# Altium footprint library En.PcbLib: 157 footprints (part 4 of 10)
Each footprint in its own frame and in the unit in brackets; x right, y up, seen from the top. Pads: shape width x height; smd on the part's side, far side on the other; paste and mask are expansions set on the pad; w line width, h text height; cw(c..) or ccw(c..) is an arc to the next point about the centre after c.
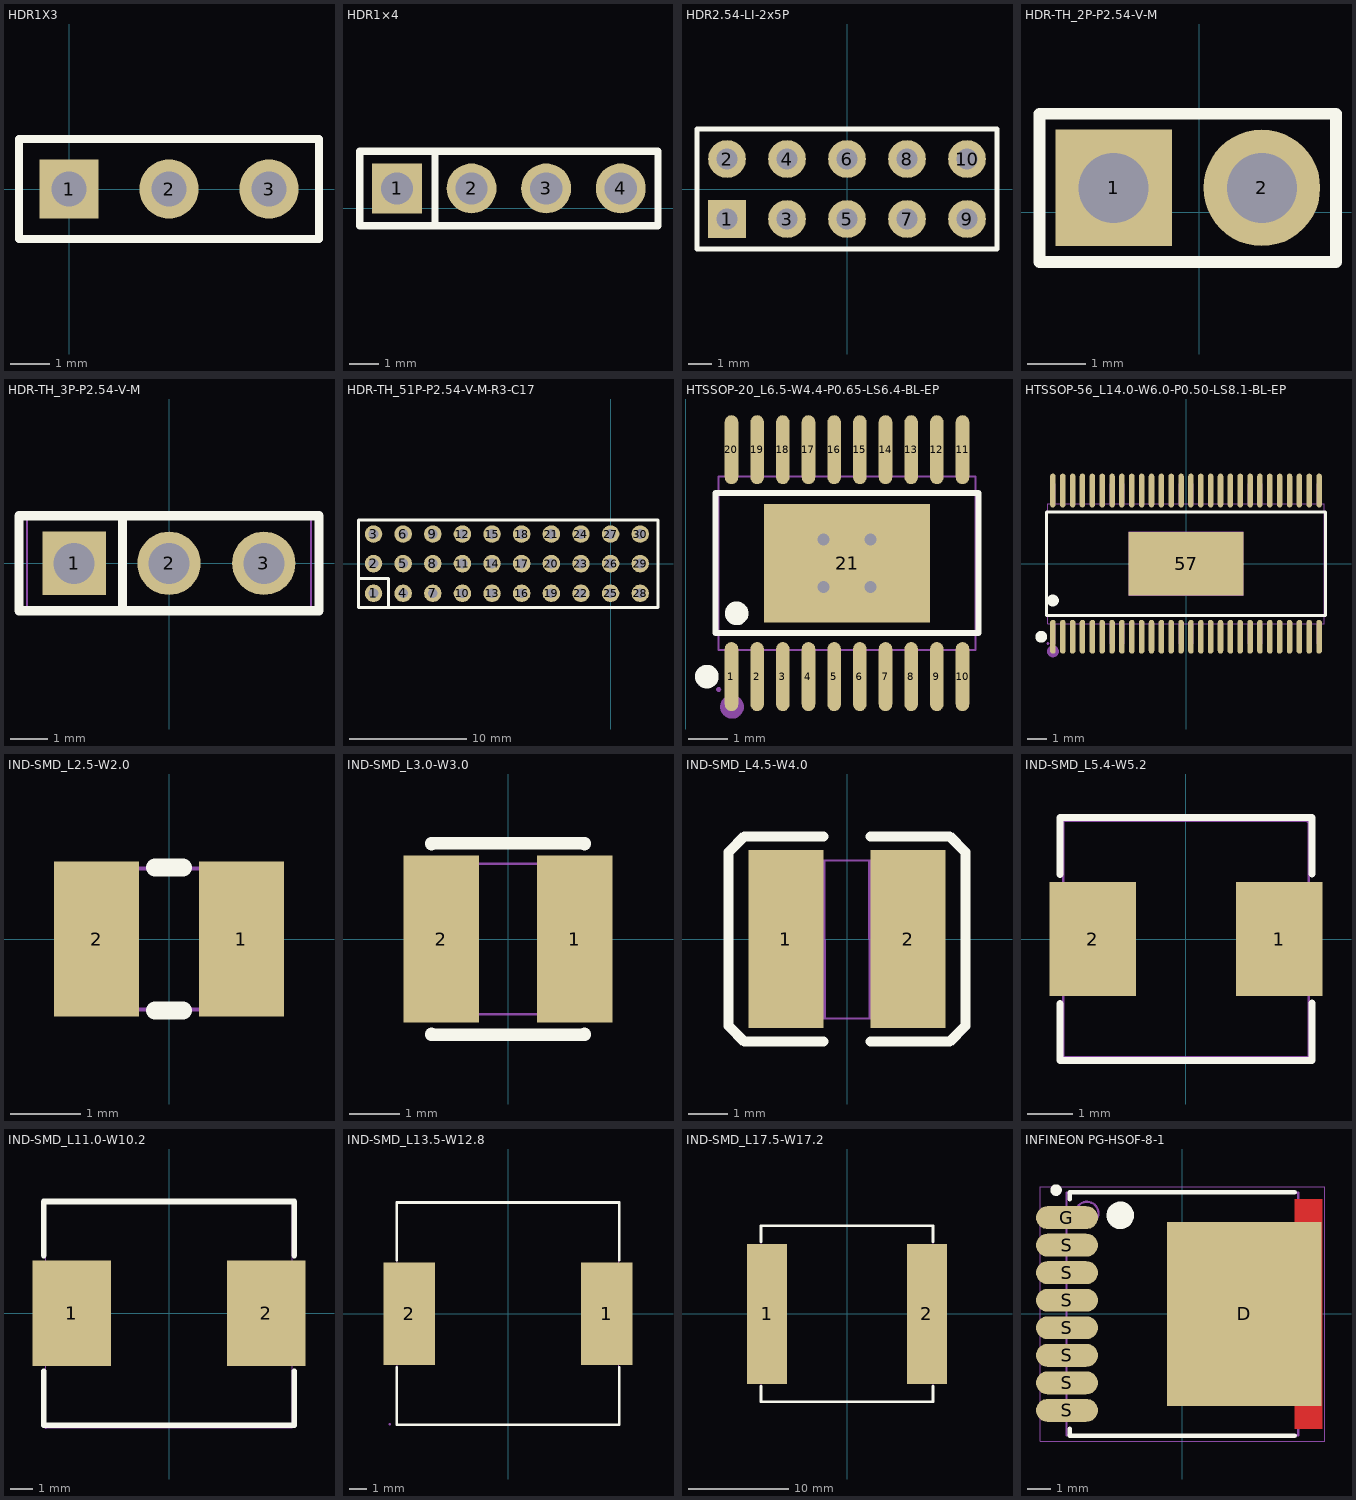
[diagram p3: the footprints below, top view; thin cyan lines are the x and y axes]

## HDR1X3 [mm] "Connector; Header; 3 Position"
pads (3):
  rect 1.5x1.5 hole 0.9: 1(0,0)
  round 1.5 hole 0.9: 2(2.54,0) 3(5.08,0)
Top Overlay:
  lines w0.2: -1.27,-1.27 6.35,-1.27 6.35,1.27 -1.27,1.27 -1.27,-1.27

## HDR1×4 [mm]
pads (4):
  rect 1.7x1.7 hole 1.1: 1(27.492,0.675)
  round 1.7 hole 1.1: 2(30.032,0.675) 3(32.572,0.675) 4(35.112,0.675)
Top Overlay:
  lines w0.254: 28.785,-0.595 28.785,1.945 ; 28.785,1.945 26.222,1.945 26.222,-0.595 36.382,-0.595 36.382,1.945 28.785,1.945
Mechanical 15:
  region: 34.792,0.995 35.432,0.995 35.432,0.355 34.792,0.355
  region: 32.252,0.995 32.892,0.995 32.892,0.355 32.252,0.355
  region: 29.712,0.995 30.352,0.995 30.352,0.355 29.712,0.355
  region: 27.172,0.995 27.812,0.995 27.812,0.355 27.172,0.355
  region: 26.282,-0.575 26.282,-0.55 26.247,-0.515 26.197,-0.515 26.162,-0.55 26.162,-0.575 26.162,-0.6 26.197,-0.635 26.247,-0.635 26.282,-0.6
  lines w0.051: 26.222,-0.575 36.382,-0.575 36.382,1.925 26.222,1.925 26.222,-0.575

## HDR2.54-LI-2x5P [mm] "双排排针，5x2脚"
pads (10):
  rect 1.6x1.6 hole 0.9: 1(-5.08,-1.27)
  round 1.6 hole 0.9: 2(-5.08,1.27) 3(-2.54,-1.27) 4(-2.54,1.27) 5(0,-1.27) 6(0,1.27) 7(2.54,-1.27) 8(2.54,1.27) 9(5.08,-1.27) 10(5.08,1.27)
Top Overlay:
  lines w0.2: -6.35,-2.54 6.35,-2.54 6.35,2.54 -6.35,2.54 -6.35,-2.54
3D body "HDR2.54-1x2P.STEP": height 8.5, standoff -3, extent 3.81,-2.54 6.35,2.54
3D body "HDR2.54-1x2P.STEP": height 8.5, standoff -3, extent -3.81,-2.54 -1.27,2.54
3D body "HDR2.54-1x2P.STEP": height 8.5, standoff -3, extent -6.35,-2.54 -3.81,2.54
3D body "HDR2.54-1x2P.STEP": height 8.5, standoff -3, extent 1.27,-2.54 3.81,2.54
3D body "HDR2.54-1x2P.STEP": height 8.5, standoff -3, extent -1.27,-2.54 1.27,2.54

## HDR-TH_2P-P2.54-V-M [mm]
pads (2):
  rect 2x2 hole 1.2: 1(-1.464,0.421)
  round 2 hole 1.2: 2(1.076,0.421)
Top Overlay:
  lines w0.203: -2.734,-0.849 2.346,-0.849 2.346,1.691 -0.829,1.691 -2.734,1.691 -2.734,-0.849
Mechanical 15:
  region: -2.674,-0.829 -2.674,-0.804 -2.709,-0.769 -2.759,-0.769 -2.794,-0.804 -2.794,-0.829 -2.794,-0.854 -2.759,-0.889 -2.709,-0.889 -2.674,-0.854
  region: 0.756,0.741 1.396,0.741 1.396,0.101 0.756,0.101
  region: -1.784,0.741 -1.144,0.741 -1.144,0.101 -1.784,0.101
  lines w0.051: -2.734,-0.829 -2.734,1.671 2.346,1.671 2.346,-0.829 -2.734,-0.829

## HDR-TH_3P-P2.54-V-M [mm]
pads (3):
  rect 1.7x1.7 hole 1.1: 1(-2.54,0)
  round 1.7 hole 1.1: 2(0,0) 3(2.54,0)
Top Overlay:
  lines w0.254: -1.246,-1.27 -1.246,1.27 ; -4.02,-1.27 -4.02,1.27 4.02,1.27 4.02,-1.27 -4.02,-1.27
Mechanical 15:
  region: -2.86,0.32 -2.22,0.32 -2.22,-0.32 -2.86,-0.32
  region: -0.32,0.32 0.32,0.32 0.32,-0.32 -0.32,-0.32
  region: 2.22,0.32 2.86,0.32 2.86,-0.32 2.22,-0.32
  region: -3.75,-1.25 -3.751,-1.226 -3.786,-1.192 -3.834,-1.192 -3.869,-1.226 -3.87,-1.25 -3.869,-1.274 -3.834,-1.308 -3.786,-1.308 -3.751,-1.274
  lines w0.051: -3.81,-1.25 3.81,-1.25 3.81,1.25 -3.81,1.25 -3.81,-1.25
3D body "User Library-1x3 TH Pitch 2_54mm (1).SLDPRT": height 9.5, standoff -3.2, extent -3.81,-1.27 3.81,1.27

## HDR-TH_51P-P2.54-V-M-R3-C17 [mm]
pads (30):
  round 1.5 hole 0.84: 1(-20.32,-2.54) 2(-20.32,0) 3(-20.32,2.54) 4(-17.78,-2.54) 5(-17.78,0) 6(-17.78,2.54) 7(-15.24,-2.54) 8(-15.24,0) 9(-15.24,2.54) 10(-12.7,-2.54) 11(-12.7,0) 12(-12.7,2.54) 13(-10.16,-2.54) 14(-10.16,0) 15(-10.16,2.54) 16(-7.62,-2.54) 17(-7.62,0) 18(-7.62,2.54) 19(-5.08,-2.54) 20(-5.08,0) 21(-5.08,2.54) 22(-2.54,-2.54) 23(-2.54,0) 24(-2.54,2.54) 25(0,-2.54) 26(0,0) 27(0,2.54) 28(2.54,-2.54) 29(2.54,0) 30(2.54,2.54)
Top Overlay:
  lines w0.254: -21.59,-1.27 -19.05,-1.27 -19.055,-3.75 ; -21.59,-3.75 -21.59,3.75 4.064,3.75 4.064,-3.75 -21.59,-3.75
Mechanical 15:
  drawing of 35 lines, arcs and shapes, not listed

## HTSSOP-20_L6.5-W4.4-P0.65-LS6.4-BL-EP [mm]
pads (21):
  oval 0.343x1.747 smd: 1(1.155,-8.356) 2(1.805,-8.356) 3(2.455,-8.356) 4(3.105,-8.356) 5(3.755,-8.356) 6(4.405,-8.356) 7(5.055,-8.356) 8(5.705,-8.356) 9(6.355,-8.356) 10(7.005,-8.356) 11(7.005,-2.61) 12(6.355,-2.61) 13(5.705,-2.61) 14(5.055,-2.61) 15(4.405,-2.61) 16(3.755,-2.61) 17(3.105,-2.61) 18(2.455,-2.61) 19(1.805,-2.61) 20(1.155,-2.61)
  rect 4.2x3 smd: 21(4.08,-5.483)
via 4.68,-4.883 diameter 0.61 hole 0.305
via 3.48,-4.883 diameter 0.61 hole 0.305
via 3.48,-6.083 diameter 0.61 hole 0.305
via 4.68,-6.083 diameter 0.61 hole 0.305
Top Overlay:
  circle w0.3: c0.531,-8.356 r0.15
  circle w0.3: c1.286,-6.753 r0.15
  lines w0.152: 0.754,-7.254 0.754,-3.711 7.406,-3.711 7.406,-7.254 0.754,-7.254
Mechanical 6:
  circle w0.3: c1.168,-9.121 r0.15
Mechanical 15:
  drawing of 46 lines, arcs and shapes, not listed
3D body "User Library-HTSSOP20.sldprt": height 0.95, standoff -0.06, extent 0.838,-8.694 7.338,-2.28

## HTSSOP-56_L14.0-W6.0-P0.50-LS8.1-BL-EP [mm]
pads (57):
  oval 0.28x1.715 smd: 1(-6.75,-3.708) 2(-6.25,-3.708) 3(-5.75,-3.708) 4(-5.25,-3.708) 5(-4.75,-3.708) 6(-4.25,-3.708) 7(-3.75,-3.708) 8(-3.25,-3.708) 9(-2.75,-3.708) 10(-2.25,-3.708) 11(-1.75,-3.708) 12(-1.25,-3.708) 13(-0.75,-3.708) 14(-0.25,-3.708) 15(0.25,-3.708) 16(0.75,-3.708) 17(1.25,-3.708) 18(1.75,-3.708) 19(2.25,-3.708) 20(2.75,-3.708) 21(3.25,-3.708) 22(3.75,-3.708) 23(4.25,-3.708) 24(4.75,-3.708) 25(5.25,-3.708) 26(5.75,-3.708) 27(6.25,-3.708) 28(6.75,-3.708) 29(6.75,3.708) 30(6.25,3.708) 31(5.75,3.708) 32(5.25,3.708) 33(4.75,3.708) 34(4.25,3.708) 35(3.75,3.708) 36(3.25,3.708) 37(2.75,3.708) 38(2.25,3.708) 39(1.75,3.708) 40(1.25,3.708) 41(0.75,3.708) 42(0.25,3.708) 43(-0.25,3.708) 44(-0.75,3.708) 45(-1.25,3.708) 46(-1.75,3.708) 47(-2.25,3.708) 48(-2.75,3.708) 49(-3.25,3.708) 50(-3.75,3.708) 51(-4.25,3.708) 52(-4.75,3.708) 53(-5.25,3.708) 54(-5.75,3.708) 55(-6.25,3.708) 56(-6.75,3.708)
  rect 5.825x3.235 smd: 57(0,0)
Top Overlay:
  circle w0.3: c-7.342,-3.708 r0.15
  circle w0.3: c-6.75,-1.869 r0.15
  lines w0.152: -7.076,-2.621 7.076,-2.621 7.076,2.622 -7.076,2.622 -7.076,-2.621
Mechanical 6:
  circle w0.3: c-6.75,-4.45 r0.15
Mechanical 15:
  drawing of 118 lines, arcs and shapes, not listed
3D body "User Library-HTSSOP-56_Part_HTSSOP56.SLDPRT": height 0.99, standoff -0.01, extent -7,-3.1 7,3.1
3D body "User Library-HTSSOP-56_leg_TSSOP56.SLDPRT": height 0.7, standoff 0, extent -6.858,3.056 -6.598,4.056
3D body "User Library-HTSSOP-56_leg_TSSOP56.SLDPRT": height 0.7, standoff 0, extent 6.619,3.056 6.879,4.056
3D body "User Library-HTSSOP-56_leg_TSSOP56.SLDPRT": height 0.7, standoff 0, extent 6.12,3.056 6.38,4.056
3D body "User Library-HTSSOP-56_leg_TSSOP56.SLDPRT": height 0.7, standoff 0, extent 5.622,3.056 5.882,4.056
3D body "User Library-HTSSOP-56_leg_TSSOP56.SLDPRT": height 0.7, standoff 0, extent 5.123,3.056 5.383,4.056
3D body "User Library-HTSSOP-56_leg_TSSOP56.SLDPRT": height 0.7, standoff 0, extent 4.624,3.056 4.884,4.056
3D body "User Library-HTSSOP-56_leg_TSSOP56.SLDPRT": height 0.7, standoff 0, extent 4.126,3.056 4.386,4.056
3D body "User Library-HTSSOP-56_leg_TSSOP56.SLDPRT": height 0.7, standoff 0, extent 3.627,3.056 3.887,4.056
3D body "User Library-HTSSOP-56_leg_TSSOP56.SLDPRT": height 0.7, standoff 0, extent 3.129,3.056 3.389,4.056
3D body "User Library-HTSSOP-56_leg_TSSOP56.SLDPRT": height 0.7, standoff 0, extent 2.63,3.056 2.89,4.056
3D body "User Library-HTSSOP-56_leg_TSSOP56.SLDPRT": height 0.7, standoff 0, extent 2.131,3.056 2.391,4.056
3D body "User Library-HTSSOP-56_leg_TSSOP56.SLDPRT": height 0.7, standoff 0, extent 1.633,3.056 1.893,4.056
3D body "User Library-HTSSOP-56_leg_TSSOP56.SLDPRT": height 0.7, standoff 0, extent 1.134,3.056 1.394,4.056
3D body "User Library-HTSSOP-56_leg_TSSOP56.SLDPRT": height 0.7, standoff 0, extent 0.636,3.056 0.896,4.056
3D body "User Library-HTSSOP-56_leg_TSSOP56.SLDPRT": height 0.7, standoff 0, extent 0.137,3.056 0.397,4.056
3D body "User Library-HTSSOP-56_leg_TSSOP56.SLDPRT": height 0.7, standoff 0, extent -0.362,3.056 -0.102,4.056
3D body "User Library-HTSSOP-56_leg_TSSOP56.SLDPRT": height 0.7, standoff 0, extent -0.86,3.056 -0.6,4.056
3D body "User Library-HTSSOP-56_leg_TSSOP56.SLDPRT": height 0.7, standoff 0, extent -1.359,3.056 -1.099,4.056
3D body "User Library-HTSSOP-56_leg_TSSOP56.SLDPRT": height 0.7, standoff 0, extent -1.857,3.056 -1.597,4.056
3D body "User Library-HTSSOP-56_leg_TSSOP56.SLDPRT": height 0.7, standoff 0, extent -2.356,3.056 -2.096,4.056
3D body "User Library-HTSSOP-56_leg_TSSOP56.SLDPRT": height 0.7, standoff 0, extent -2.854,3.056 -2.594,4.056
3D body "User Library-HTSSOP-56_leg_TSSOP56.SLDPRT": height 0.7, standoff 0, extent -3.353,3.056 -3.093,4.056
3D body "User Library-HTSSOP-56_leg_TSSOP56.SLDPRT": height 0.7, standoff 0, extent -3.852,3.056 -3.592,4.056
3D body "User Library-HTSSOP-56_leg_TSSOP56.SLDPRT": height 0.7, standoff 0, extent -4.35,3.056 -4.09,4.056
3D body "User Library-HTSSOP-56_leg_TSSOP56.SLDPRT": height 0.7, standoff 0, extent -4.849,3.056 -4.589,4.056
3D body "User Library-HTSSOP-56_leg_TSSOP56.SLDPRT": height 0.7, standoff 0, extent -5.347,3.056 -5.087,4.056
3D body "User Library-HTSSOP-56_leg_TSSOP56.SLDPRT": height 0.7, standoff 0, extent -5.848,3.056 -5.588,4.056
3D body "User Library-HTSSOP-56_leg_TSSOP56.SLDPRT": height 0.7, standoff 0, extent -6.35,3.056 -6.09,4.056
3D body "User Library-HTSSOP-56_leg_TSSOP56.SLDPRT": height 0.7, standoff 0, extent 6.598,-4.056 6.858,-3.056
3D body "User Library-HTSSOP-56_leg_TSSOP56.SLDPRT": height 0.7, standoff 0, extent -6.879,-4.056 -6.619,-3.056
3D body "User Library-HTSSOP-56_leg_TSSOP56.SLDPRT": height 0.7, standoff 0, extent -6.38,-4.056 -6.12,-3.056
3D body "User Library-HTSSOP-56_leg_TSSOP56.SLDPRT": height 0.7, standoff 0, extent -5.882,-4.056 -5.622,-3.056
3D body "User Library-HTSSOP-56_leg_TSSOP56.SLDPRT": height 0.7, standoff 0, extent -5.383,-4.056 -5.123,-3.056
3D body "User Library-HTSSOP-56_leg_TSSOP56.SLDPRT": height 0.7, standoff 0, extent -4.884,-4.056 -4.624,-3.056
3D body "User Library-HTSSOP-56_leg_TSSOP56.SLDPRT": height 0.7, standoff 0, extent -4.386,-4.056 -4.126,-3.056
3D body "User Library-HTSSOP-56_leg_TSSOP56.SLDPRT": height 0.7, standoff 0, extent -3.887,-4.056 -3.627,-3.056
3D body "User Library-HTSSOP-56_leg_TSSOP56.SLDPRT": height 0.7, standoff 0, extent -3.389,-4.056 -3.129,-3.056
3D body "User Library-HTSSOP-56_leg_TSSOP56.SLDPRT": height 0.7, standoff 0, extent -2.89,-4.056 -2.63,-3.056
3D body "User Library-HTSSOP-56_leg_TSSOP56.SLDPRT": height 0.7, standoff 0, extent -2.391,-4.056 -2.131,-3.056
3D body "User Library-HTSSOP-56_leg_TSSOP56.SLDPRT": height 0.7, standoff 0, extent -1.893,-4.056 -1.633,-3.056
3D body "User Library-HTSSOP-56_leg_TSSOP56.SLDPRT": height 0.7, standoff 0, extent -1.394,-4.056 -1.134,-3.056
3D body "User Library-HTSSOP-56_leg_TSSOP56.SLDPRT": height 0.7, standoff 0, extent -0.896,-4.056 -0.636,-3.056
3D body "User Library-HTSSOP-56_leg_TSSOP56.SLDPRT": height 0.7, standoff 0, extent -0.397,-4.056 -0.137,-3.056
3D body "User Library-HTSSOP-56_leg_TSSOP56.SLDPRT": height 0.7, standoff 0, extent 0.102,-4.056 0.362,-3.056
3D body "User Library-HTSSOP-56_leg_TSSOP56.SLDPRT": height 0.7, standoff 0, extent 0.6,-4.056 0.86,-3.056
3D body "User Library-HTSSOP-56_leg_TSSOP56.SLDPRT": height 0.7, standoff 0, extent 1.099,-4.056 1.359,-3.056
3D body "User Library-HTSSOP-56_leg_TSSOP56.SLDPRT": height 0.7, standoff 0, extent 1.597,-4.056 1.857,-3.056
3D body "User Library-HTSSOP-56_leg_TSSOP56.SLDPRT": height 0.7, standoff 0, extent 2.096,-4.056 2.356,-3.056
3D body "User Library-HTSSOP-56_leg_TSSOP56.SLDPRT": height 0.7, standoff 0, extent 2.594,-4.056 2.854,-3.056
3D body "User Library-HTSSOP-56_leg_TSSOP56.SLDPRT": height 0.7, standoff 0, extent 3.093,-4.056 3.353,-3.056
3D body "User Library-HTSSOP-56_leg_TSSOP56.SLDPRT": height 0.7, standoff 0, extent 3.592,-4.056 3.852,-3.056
3D body "User Library-HTSSOP-56_leg_TSSOP56.SLDPRT": height 0.7, standoff 0, extent 4.09,-4.056 4.35,-3.056
3D body "User Library-HTSSOP-56_leg_TSSOP56.SLDPRT": height 0.7, standoff 0, extent 4.589,-4.056 4.849,-3.056
3D body "User Library-HTSSOP-56_leg_TSSOP56.SLDPRT": height 0.7, standoff 0, extent 5.087,-4.056 5.347,-3.056
3D body "User Library-HTSSOP-56_leg_TSSOP56.SLDPRT": height 0.7, standoff 0, extent 5.588,-4.056 5.848,-3.056
3D body "User Library-HTSSOP-56_leg_TSSOP56.SLDPRT": height 0.7, standoff 0, extent 6.09,-4.056 6.35,-3.056

## IND-SMD_L2.5-W2.0 [mm]
pads (2):
  rect 1.2x2.2 smd: 1(1.028,0) 2(-1.028,0)
Top Overlay:
  lines w0.254: -0.197,-1.016 0.197,-1.016 ; -0.197,1.016 0.197,1.016
Mechanical 15:
  region: -1.16,-0.97 -1.161,-0.946 -1.196,-0.912 -1.244,-0.912 -1.279,-0.946 -1.28,-0.97 -1.279,-0.994 -1.244,-1.028 -1.196,-1.028 -1.161,-0.994
  region: 0.45,1 1.25,1 1.25,-1 0.45,-1
  region: -1.25,1 -0.45,1 -0.45,-1 -1.25,-1
  lines w0.051: -1.25,-1 1.25,-1 1.25,1 -1.25,1 -1.25,-1
3D body "fhd252012s-2r2mt.step": height 1.2, standoff 0, extent -1.26,-1 1.26,1

## IND-SMD_L3.0-W3.0 [mm]
pads (2):
  rect 1.5x3.32 smd: 1(1.328,0) 2(-1.328,0)
Top Overlay:
  lines w0.254: -1.524,-1.891 -1.524,-1.905 1.524,-1.905 1.524,-1.891 ; -1.524,1.891 -1.524,1.905 1.524,1.905 1.524,1.891
Mechanical 15:
  region: -1.5,-1.45 -1.5,1.45 -0.75,1.45 -0.75,-1.45
  region: 1.5,-1.45 1.5,1.45 0.75,1.45 0.75,-1.45
  region: -1.44,-1.5 -1.44,-1.475 -1.475,-1.44 -1.525,-1.44 -1.56,-1.475 -1.56,-1.5 -1.56,-1.525 -1.525,-1.56 -1.475,-1.56 -1.44,-1.525
  lines w0.051: -1.5,-1.5 -1.5,1.5 1.5,1.5 1.5,-1.5 -1.5,-1.5
3D body "User Library-nr3015.SLDPRT": height 1.35, standoff -0.14, extent -1.5,-1.5 1.5,1.5

## IND-SMD_L4.5-W4.0 [mm]
pads (2):
  rect 1.9x4.5 smd: 1(-1.55,0) 2(1.55,0)
Top Overlay:
  lines w0.254: -0.599,-2.601 -2.601,-2.601 -3,-2.2 -3,2.2 -2.601,2.601 -0.599,2.601 ; 0.599,-2.601 2.601,-2.601 3,-2.2 3,2.2 2.601,2.601 0.599,2.601
Mechanical 15:
  drawing of 84 lines, arcs and shapes, not listed
3D body "cd43n-220m.step": height 3.21, standoff -0.01, extent -2.163,-2 2.161,2

## IND-SMD_L5.4-W5.2 [mm]
pads (2):
  rect 1.9x2.5 smd: 1(2.05,0) 2(-2.05,0)
Top Overlay:
  lines w0.152: -2.775,-1.42 -2.776,-2.676 2.776,-2.676 2.775,-1.41 ; -2.775,1.42 -2.776,2.676 2.776,2.676 2.775,1.43
Mechanical 15:
  region: -2.7,1.05 -1.5,1.05 -1.5,-1.05 -2.7,-1.05
  region: 1.5,1.05 2.7,1.05 2.7,-1.05 1.5,-1.05
  region: 2.76,2.6 2.759,2.624 2.724,2.658 2.676,2.658 2.641,2.624 2.64,2.6 2.641,2.576 2.676,2.542 2.724,2.542 2.759,2.576
  lines w0.051: -2.7,-2.6 2.7,-2.6 2.7,2.6 -2.7,2.6 -2.7,-2.6
3D body "xr0530-100m.step": height 3.1, standoff 0, extent -2.7,-2.6 2.7,2.6

## IND-SMD_L11.0-W10.2 [mm]
pads (2):
  rect 3.5x4.7 smd: 1(-4.35,0) 2(4.35,0)
Top Overlay:
  lines w0.254: -5.6,-2.581 -5.6,-5 5.6,-5 5.6,-2.581 ; -5.6,2.581 -5.6,5 5.6,5 5.6,2.581
Mechanical 15:
  region: 5.5,1.5 5.5,-1.5 3.5,-1.5 3.5,1.5
  region: -3.5,1.5 -3.5,-1.5 -5.5,-1.5 -5.5,1.5
  region: -5.44,-5.1 -5.441,-5.076 -5.476,-5.042 -5.524,-5.042 -5.559,-5.076 -5.56,-5.1 -5.559,-5.124 -5.524,-5.158 -5.476,-5.158 -5.441,-5.124
  lines w0.051: -5.5,-5.1 -5.5,5.1 5.5,5.1 5.5,-5.1 -5.5,-5.1
3D body "cxp1050-4r7m-ag(4.7uh).step": height 4, standoff -0.01, extent -5.5,-5.1 5.5,5.1

## IND-SMD_L13.5-W12.8 [mm]
pads (2):
  rect 2.924x5.82 smd: 1(5.628,0) 2(-5.628,0)
Top Overlay:
  lines w0.152: -6.326,-3.062 -6.326,-6.326 6.326,-6.326 6.326,-3.062 ; -6.326,3.062 -6.326,6.326 6.326,6.326 6.326,3.062
Mechanical 15:
  region: -6.665,-6.3 -6.666,-6.276 -6.701,-6.243 -6.749,-6.243 -6.784,-6.276 -6.785,-6.3 -6.784,-6.324 -6.749,-6.357 -6.701,-6.357 -6.666,-6.324
  region: -6.725,1.925 -4.75,1.925 -4.75,-1.925 -6.725,-1.925
  region: 4.75,1.925 6.725,1.925 6.725,-1.925 4.75,-1.925
  lines w0.051: -6.3,-6.3 -6.3,6.3 6.3,6.3 6.3,-6.3 -6.3,-6.3
3D body "cxp1250-4r7m-hg(4.7uh).step": height 6.6, standoff -0.05, extent -6.75,-6.4 6.75,6.4

## IND-SMD_L17.5-W17.2 [mm]
pads (2):
  rect 4x14 smd: 1(-8,0) 2(8,0)
Top Overlay:
  lines w0.254: -8.6,-7.231 -8.6,-8.8 8.6,-8.8 8.6,-7.231 ; -8.6,7.231 -8.6,8.8 8.6,8.8 8.6,7.231
Mechanical 15:
  region: -8.6,5.97 -6.1,5.97 -6.1,-5.97 -8.6,-5.97
  region: 6.1,5.97 8.6,5.97 8.6,-5.97 6.1,-5.97
  region: -8.54,-8.75 -8.541,-8.726 -8.576,-8.692 -8.624,-8.693 -8.659,-8.726 -8.66,-8.75 -8.659,-8.774 -8.624,-8.808 -8.576,-8.808 -8.541,-8.774
  lines w0.051: -8.6,-8.75 8.6,-8.75 8.6,8.75 -8.6,8.75 -8.6,-8.75
3D body "smms1770-101m.step": height 6.8, standoff -0.2, extent -8.75,-8.75 8.75,8.75

## INFINEON PG-HSOF-8-1 [mm]
height 0.35
pads (9):
  rect 6.75x8 smd: D(2.7,0)
  oval 2.7x1 smd: G(-5.025,4.2) S(-5.025,-4.2) S(-5.025,-3) S(-5.025,-1.8) S(-5.025,-0.6) S(-5.025,0.6) S(-5.025,1.8) S(-5.025,3)
Top Layer:
  region: 4.9,5 6.1,5 6.1,-5 4.9,-5
Top Overlay:
  circle w0.25: c-5.5,5.4 r0.125
  circle w0.6: c-2.7,4.3 r0.3
  lines w0.2: -4.9,-5 -4.9,-5.3 4.9,-5.3 ; -4.9,5 -4.9,5.3 4.9,5.3
Mechanical 13:
  circle w0.1: c-4.15,4.39 r0.5
  lines w0.1: -5.05,-5.29 -5.05,5.29 5.05,5.29 5.05,-5.29 -5.05,-5.29
Mechanical 15:
  lines w0.05: -6.2,-5.55 -6.2,5.55 6.2,5.55 6.2,-5.55 -6.2,-5.55
  lines w0.1: -0.5,0 0.5,0 ; 0,-0.5 0,0.5
3D body "PG-HSOF-8-1.STEP": height 2.3, standoff 0, extent -5.815,-4.95 5.915,4.95